# Altium footprint library PcbLib1.PcbLib: 34 footprints (part 2 of 3)
Each footprint in its own frame and in the unit in brackets; x right, y up, seen from the top. Pads: shape width x height; smd on the part's side, far side on the other; paste and mask are expansions set on the pad; w line width, h text height; cw(c..) or ccw(c..) is an arc to the next point about the centre after c.
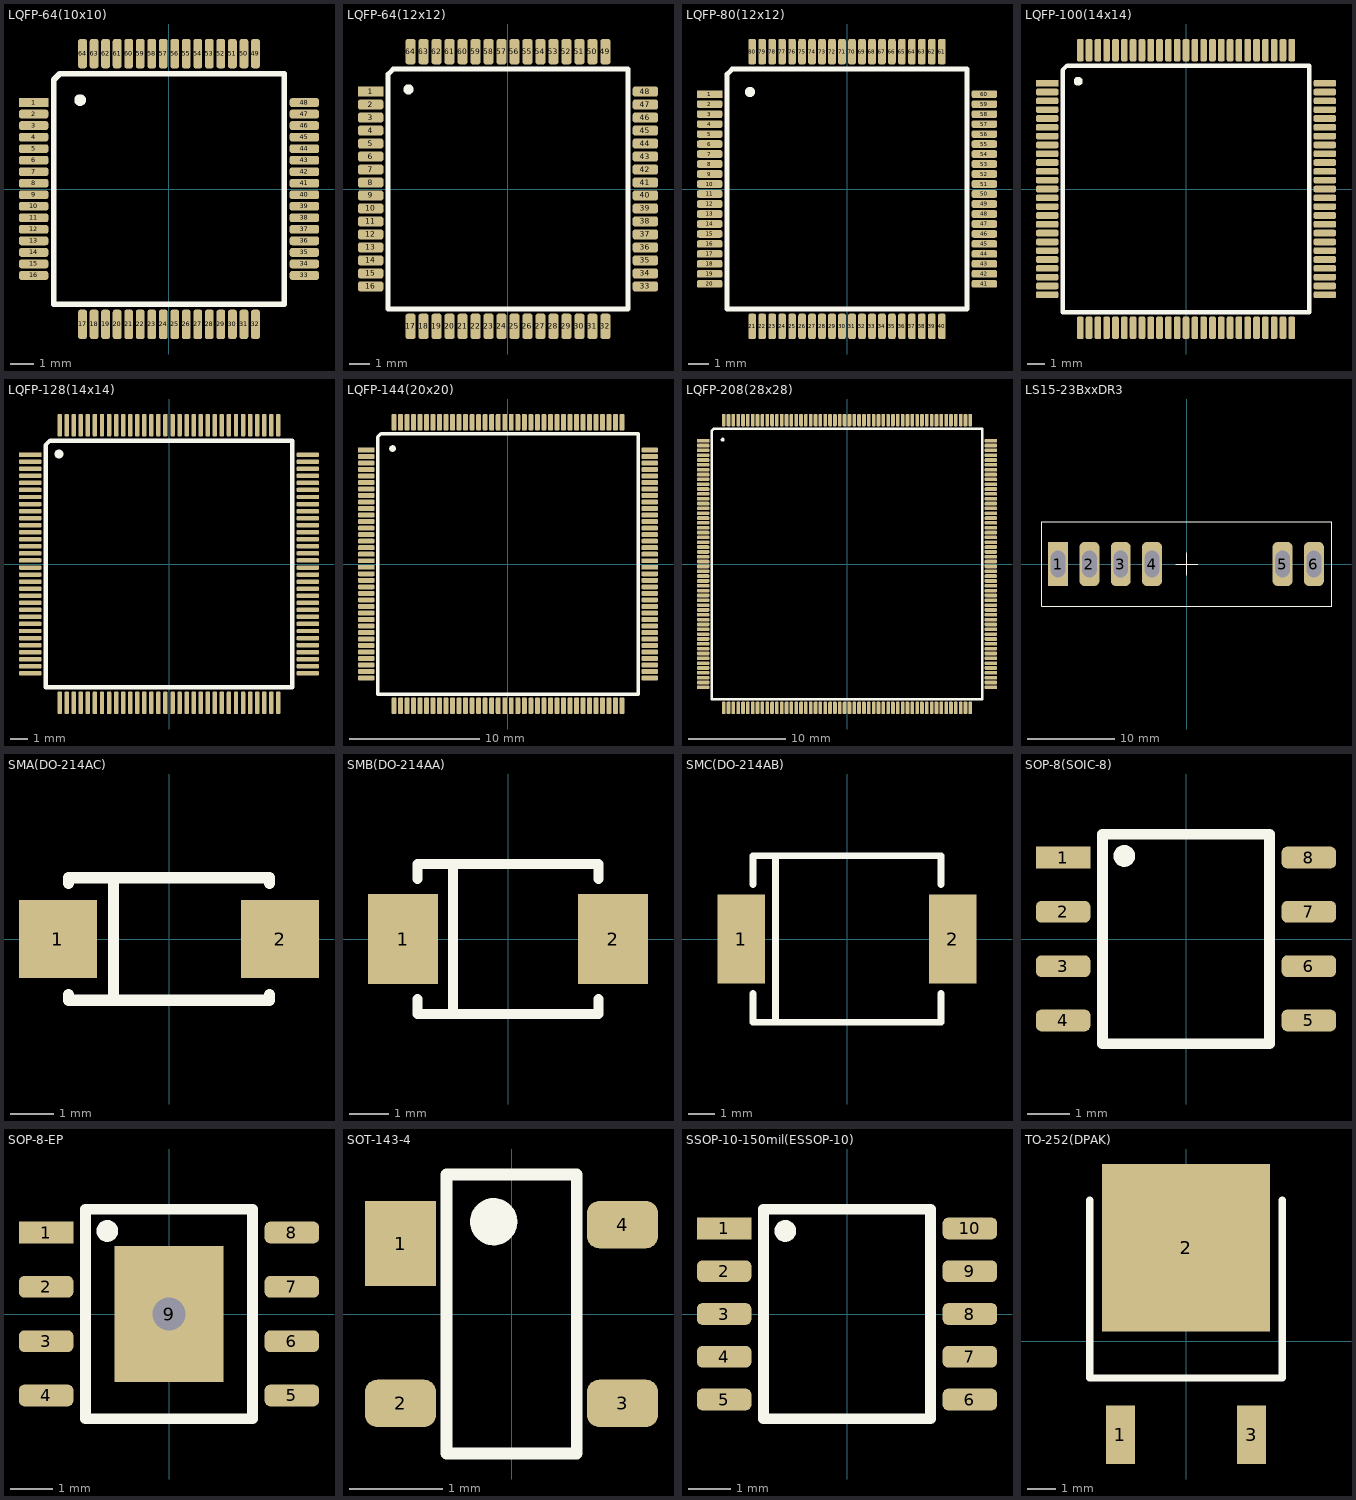
[diagram p1: the footprints below, top view; thin cyan lines are the x and y axes]

## LQFP-64(10x10) [mil]
pads (64):
  rect 50x15 smd: 1(-231.22,147.64)
  rrect50% 50x15 smd: 2(-231.22,127.95) 3(-231.22,108.27) 4(-231.22,88.58) 5(-231.22,68.9) 6(-231.22,49.21) 7(-231.22,29.53) 8(-231.22,9.84) 9(-231.22,-9.84) 10(-231.22,-29.53) 11(-231.22,-49.21) 12(-231.22,-68.9) 13(-231.22,-88.58) 14(-231.22,-108.27) 15(-231.22,-127.95) 16(-231.22,-147.64) 33(231.22,-147.64) 34(231.22,-127.95) 35(231.22,-108.27) 36(231.22,-88.58) 37(231.22,-68.9) 38(231.22,-49.21) 39(231.22,-29.53) 40(231.22,-9.84) 41(231.22,9.84) 42(231.22,29.53) 43(231.22,49.21) 44(231.22,68.9) 45(231.22,88.58) 46(231.22,108.27) 47(231.22,127.95) 48(231.22,147.64)
  rrect50% 15x50 smd: 17(-147.64,-231.22) 18(-127.95,-231.22) 19(-108.27,-231.22) 20(-88.58,-231.22) 21(-68.9,-231.22) 22(-49.21,-231.22) 23(-29.53,-231.22) 24(-9.84,-231.22) 25(9.84,-231.22) 26(29.53,-231.22) 27(49.21,-231.22) 28(68.9,-231.22) 29(88.58,-231.22) 30(108.27,-231.22) 31(127.95,-231.22) 32(147.64,-231.22) 49(147.64,231.22) 50(127.95,231.22) 51(108.27,231.22) 52(88.58,231.22) 53(68.9,231.22) 54(49.21,231.22) 55(29.53,231.22) 56(9.84,231.22) 57(-9.84,231.22) 58(-29.53,231.22) 59(-49.21,231.22) 60(-68.9,231.22) 61(-88.58,231.22) 62(-108.27,231.22) 63(-127.95,231.22) 64(-147.64,231.22)
Top Overlay:
  circle w10: c-151.85,151.85 r5
  lines w10: -196.85,-196.85 -196.85,186.85 -186.85,196.85 196.85,196.85 196.85,-196.85 -196.85,-196.85
3D body "LQFP-64(10x10).step": height 63.11, standoff 0, extent -236.1,-236.1 236.1,236.1

## LQFP-64(12x12) [mil]
pads (64):
  rect 50x20 smd: 1(-270.59,191.93)
  rrect50% 50x20 smd: 2(-270.59,166.34) 3(-270.59,140.75) 4(-270.59,115.16) 5(-270.59,89.57) 6(-270.59,63.98) 7(-270.59,38.39) 8(-270.59,12.79) 9(-270.59,-12.8) 10(-270.59,-38.39) 11(-270.59,-63.98) 12(-270.59,-89.57) 13(-270.59,-115.16) 14(-270.59,-140.75) 15(-270.59,-166.34) 16(-270.59,-191.93) 33(270.59,-191.93) 34(270.59,-166.34) 35(270.59,-140.75) 36(270.59,-115.16) 37(270.59,-89.57) 38(270.59,-63.98) 39(270.59,-38.39) 40(270.59,-12.8) 41(270.59,12.79) 42(270.59,38.39) 43(270.59,63.98) 44(270.59,89.57) 45(270.59,115.16) 46(270.59,140.75) 47(270.59,166.34) 48(270.59,191.93)
  rrect50% 20x50 smd: 17(-191.93,-270.59) 18(-166.34,-270.59) 19(-140.75,-270.59) 20(-115.16,-270.59) 21(-89.57,-270.59) 22(-63.98,-270.59) 23(-38.39,-270.59) 24(-12.8,-270.59) 25(12.79,-270.59) 26(38.39,-270.59) 27(63.98,-270.59) 28(89.57,-270.59) 29(115.16,-270.59) 30(140.75,-270.59) 31(166.34,-270.59) 32(191.93,-270.59) 49(191.93,270.59) 50(166.34,270.59) 51(140.75,270.59) 52(115.16,270.59) 53(89.57,270.59) 54(63.98,270.59) 55(38.39,270.59) 56(12.79,270.59) 57(-12.8,270.59) 58(-38.39,270.59) 59(-63.98,270.59) 60(-89.57,270.59) 61(-115.16,270.59) 62(-140.75,270.59) 63(-166.34,270.59) 64(-191.93,270.59)
Top Overlay:
  circle w10: c-196.22,196.22 r5
  lines w10: -236.22,-236.22 236.22,-236.22 236.22,236.22 -226.22,236.22 -236.22,226.22 -236.22,-236.22
3D body "LQFP-64(12x12).step": height 63.11, standoff 0, extent -279.49,-279.49 279.49,279.49

## LQFP-80(12x12) [mil]
pads (80):
  rect 50x15 smd: 1(-270.59,187.01)
  rrect50% 50x15 smd: 2(-270.59,167.32) 3(-270.59,147.64) 4(-270.59,127.95) 5(-270.59,108.27) 6(-270.59,88.58) 7(-270.59,68.9) 8(-270.59,49.21) 9(-270.59,29.53) 10(-270.59,9.84) 11(-270.59,-9.84) 12(-270.59,-29.53) 13(-270.59,-49.21) 14(-270.59,-68.9) 15(-270.59,-88.58) 16(-270.59,-108.27) 17(-270.59,-127.95) 18(-270.59,-147.64) 19(-270.59,-167.32) 20(-270.59,-187.01) 41(270.59,-187.01) 42(270.59,-167.32) 43(270.59,-147.64) 44(270.59,-127.95) 45(270.59,-108.27) 46(270.59,-88.58) 47(270.59,-68.9) 48(270.59,-49.21) 49(270.59,-29.53) 50(270.59,-9.84) 51(270.59,9.84) 52(270.59,29.53) 53(270.59,49.21) 54(270.59,68.9) 55(270.59,88.58) 56(270.59,108.27) 57(270.59,127.95) 58(270.59,147.64) 59(270.59,167.32) 60(270.59,187.01)
  rrect50% 15x50 smd: 21(-187.01,-270.59) 22(-167.32,-270.59) 23(-147.64,-270.59) 24(-127.95,-270.59) 25(-108.27,-270.59) 26(-88.58,-270.59) 27(-68.9,-270.59) 28(-49.21,-270.59) 29(-29.53,-270.59) 30(-9.84,-270.59) 31(9.84,-270.59) 32(29.53,-270.59) 33(49.21,-270.59) 34(68.9,-270.59) 35(88.58,-270.59) 36(108.27,-270.59) 37(127.95,-270.59) 38(147.64,-270.59) 39(167.32,-270.59) 40(187.01,-270.59) 61(187.01,270.59) 62(167.32,270.59) 63(147.64,270.59) 64(127.95,270.59) 65(108.27,270.59) 66(88.58,270.59) 67(68.9,270.59) 68(49.21,270.59) 69(29.53,270.59) 70(9.84,270.59) 71(-9.84,270.59) 72(-29.53,270.59) 73(-49.21,270.59) 74(-68.9,270.59) 75(-88.58,270.59) 76(-108.27,270.59) 77(-127.95,270.59) 78(-147.64,270.59) 79(-167.32,270.59) 80(-187.01,270.59)
Top Overlay:
  circle w10: c-191.22,191.22 r5
  lines w10: -236.22,-236.22 236.22,-236.22 236.22,236.22 -226.22,236.22 -236.22,226.22 -236.22,-236.22
3D body "LQFP-80(12x12).step": height 63.11, standoff 0, extent -275.51,-275.51 275.51,275.51

## LQFP-100(14x14) [mil]
pads (100):
  rect 50x15 smd: 1(-309.96,236.22)
  rrect50% 50x15 smd: 2(-309.96,216.53) 3(-309.96,196.85) 4(-309.96,177.16) 5(-309.96,157.48) 6(-309.96,137.79) 7(-309.96,118.11) 8(-309.96,98.42) 9(-309.96,78.74) 10(-309.96,59.05) 11(-309.96,39.37) 12(-309.96,19.68) 13(-309.96,0) 14(-309.96,-19.69) 15(-309.96,-39.37) 16(-309.96,-59.06) 17(-309.96,-78.74) 18(-309.96,-98.43) 19(-309.96,-118.11) 20(-309.96,-137.8) 21(-309.96,-157.48) 22(-309.96,-177.17) 23(-309.96,-196.85) 24(-309.96,-216.54) 25(-309.96,-236.22) 51(309.96,-236.22) 52(309.96,-216.54) 53(309.96,-196.85) 54(309.96,-177.17) 55(309.96,-157.48) 56(309.96,-137.8) 57(309.96,-118.11) 58(309.96,-98.43) 59(309.96,-78.74) 60(309.96,-59.06) 61(309.96,-39.37) 62(309.96,-19.69) 63(309.96,0) 64(309.96,19.68) 65(309.96,39.37) 66(309.96,59.05) 67(309.96,78.74) 68(309.96,98.42) 69(309.96,118.11) 70(309.96,137.79) 71(309.96,157.48) 72(309.96,177.16) 73(309.96,196.85) 74(309.96,216.53) 75(309.96,236.22)
  rrect50% 15x50 smd: 26(-236.22,-309.96) 27(-216.54,-309.96) 28(-196.85,-309.96) 29(-177.17,-309.96) 30(-157.48,-309.96) 31(-137.8,-309.96) 32(-118.11,-309.96) 33(-98.43,-309.96) 34(-78.74,-309.96) 35(-59.06,-309.96) 36(-39.37,-309.96) 37(-19.69,-309.96) 38(0,-309.96) 39(19.68,-309.96) 40(39.37,-309.96) 41(59.05,-309.96) 42(78.74,-309.96) 43(98.42,-309.96) 44(118.11,-309.96) 45(137.79,-309.96) 46(157.48,-309.96) 47(177.16,-309.96) 48(196.85,-309.96) 49(216.53,-309.96) 50(236.22,-309.96) 76(236.22,309.96) 77(216.53,309.96) 78(196.85,309.96) 79(177.16,309.96) 80(157.48,309.96) 81(137.79,309.96) 82(118.11,309.96) 83(98.42,309.96) 84(78.74,309.96) 85(59.05,309.96) 86(39.37,309.96) 87(19.68,309.96) 88(0,309.96) 89(-19.69,309.96) 90(-39.37,309.96) 91(-59.06,309.96) 92(-78.74,309.96) 93(-98.43,309.96) 94(-118.11,309.96) 95(-137.8,309.96) 96(-157.48,309.96) 97(-177.17,309.96) 98(-196.85,309.96) 99(-216.54,309.96) 100(-236.22,309.96)
Top Overlay:
  circle w10: c-240.59,240.59 r5
  lines w10: -275.59,-275.59 -275.59,265.59 -265.59,275.59 275.59,275.59 275.59,-275.59 -275.59,-275.59
3D body "LQFP-100(14x14).step": height 63.11, standoff 0, extent -314.84,-314.84 314.84,314.84

## LQFP-128(14x14) [mil]
pads (128):
  rect 50x10 smd: 1(-309.96,244.09)
  rrect50% 50x10 smd: 2(-309.96,228.35) 3(-309.96,212.6) 4(-309.96,196.85) 5(-309.96,181.1) 6(-309.96,165.35) 7(-309.96,149.61) 8(-309.96,133.86) 9(-309.96,118.11) 10(-309.96,102.36) 11(-309.96,86.61) 12(-309.96,70.87) 13(-309.96,55.12) 14(-309.96,39.37) 15(-309.96,23.62) 16(-309.96,7.87) 17(-309.96,-7.87) 18(-309.96,-23.62) 19(-309.96,-39.37) 20(-309.96,-55.12) 21(-309.96,-70.87) 22(-309.96,-86.61) 23(-309.96,-102.36) 24(-309.96,-118.11) 25(-309.96,-133.86) 26(-309.96,-149.61) 27(-309.96,-165.35) 28(-309.96,-181.1) 29(-309.96,-196.85) 30(-309.96,-212.6) 31(-309.96,-228.35) 32(-309.96,-244.09) 65(309.96,-244.09) 66(309.96,-228.35) 67(309.96,-212.6) 68(309.96,-196.85) 69(309.96,-181.1) 70(309.96,-165.35) 71(309.96,-149.61) 72(309.96,-133.86) 73(309.96,-118.11) 74(309.96,-102.36) 75(309.96,-86.61) 76(309.96,-70.87) 77(309.96,-55.12) 78(309.96,-39.37) 79(309.96,-23.62) 80(309.96,-7.87) 81(309.96,7.87) 82(309.96,23.62) 83(309.96,39.37) 84(309.96,55.12) 85(309.96,70.87) 86(309.96,86.61) 87(309.96,102.36) 88(309.96,118.11) 89(309.96,133.86) 90(309.96,149.61) 91(309.96,165.35) 92(309.96,181.1) 93(309.96,196.85) 94(309.96,212.6) 95(309.96,228.35) 96(309.96,244.09)
  rrect50% 10x50 smd: 33(-244.09,-309.96) 34(-228.35,-309.96) 35(-212.6,-309.96) 36(-196.85,-309.96) 37(-181.1,-309.96) 38(-165.35,-309.96) 39(-149.61,-309.96) 40(-133.86,-309.96) 41(-118.11,-309.96) 42(-102.36,-309.96) 43(-86.61,-309.96) 44(-70.87,-309.96) 45(-55.12,-309.96) 46(-39.37,-309.96) 47(-23.62,-309.96) 48(-7.87,-309.96) 49(7.87,-309.96) 50(23.62,-309.96) 51(39.37,-309.96) 52(55.12,-309.96) 53(70.87,-309.96) 54(86.61,-309.96) 55(102.36,-309.96) 56(118.11,-309.96) 57(133.86,-309.96) 58(149.61,-309.96) 59(165.35,-309.96) 60(181.1,-309.96) 61(196.85,-309.96) 62(212.6,-309.96) 63(228.35,-309.96) 64(244.09,-309.96) 97(244.09,309.96) 98(228.35,309.96) 99(212.6,309.96) 100(196.85,309.96) 101(181.1,309.96) 102(165.35,309.96) 103(149.61,309.96) 104(133.86,309.96) 105(118.11,309.96) 106(102.36,309.96) 107(86.61,309.96) 108(70.87,309.96) 109(55.12,309.96) 110(39.37,309.96) 111(23.62,309.96) 112(7.87,309.96) 113(-7.87,309.96) 114(-23.62,309.96) 115(-39.37,309.96) 116(-55.12,309.96) 117(-70.87,309.96) 118(-86.61,309.96) 119(-102.36,309.96) 120(-118.11,309.96) 121(-133.86,309.96) 122(-149.61,309.96) 123(-165.35,309.96) 124(-181.1,309.96) 125(-196.85,309.96) 126(-212.6,309.96) 127(-228.35,309.96) 128(-244.09,309.96)
Top Overlay:
  circle w10: c-245.59,245.59 r5
  lines w10: -275.59,-275.59 275.59,-275.59 275.59,275.59 -265.59,275.59 -275.59,265.59 -275.59,-275.59
3D body "LQFP-128(14x14).step": height 63.11, standoff 0, extent -315,-315 315,315

## LQFP-144(20x20) [mil]
pads (144):
  rect 50x15 smd: 1(-428.07,344.49)
  rrect50% 50x15 smd: 2(-428.07,324.8) 3(-428.07,305.12) 4(-428.07,285.43) 5(-428.07,265.75) 6(-428.07,246.06) 7(-428.07,226.38) 8(-428.07,206.69) 9(-428.07,187.01) 10(-428.07,167.32) 11(-428.07,147.64) 12(-428.07,127.95) 13(-428.07,108.27) 14(-428.07,88.58) 15(-428.07,68.9) 16(-428.07,49.21) 17(-428.07,29.53) 18(-428.07,9.84) 19(-428.07,-9.84) 20(-428.07,-29.53) 21(-428.07,-49.21) 22(-428.07,-68.9) 23(-428.07,-88.58) 24(-428.07,-108.27) 25(-428.07,-127.95) 26(-428.07,-147.64) 27(-428.07,-167.32) 28(-428.07,-187.01) 29(-428.07,-206.69) 30(-428.07,-226.38) 31(-428.07,-246.06) 32(-428.07,-265.75) 33(-428.07,-285.43) 34(-428.07,-305.12) 35(-428.07,-324.8) 36(-428.07,-344.49) 73(428.07,-344.49) 74(428.07,-324.8) 75(428.07,-305.12) 76(428.07,-285.43) 77(428.07,-265.75) 78(428.07,-246.06) 79(428.07,-226.38) 80(428.07,-206.69) 81(428.07,-187.01) 82(428.07,-167.32) 83(428.07,-147.64) 84(428.07,-127.95) 85(428.07,-108.27) 86(428.07,-88.58) 87(428.07,-68.9) 88(428.07,-49.21) 89(428.07,-29.53) 90(428.07,-9.84) 91(428.07,9.84) 92(428.07,29.53) 93(428.07,49.21) 94(428.07,68.9) 95(428.07,88.58) 96(428.07,108.27) 97(428.07,127.95) 98(428.07,147.64) 99(428.07,167.32) 100(428.07,187.01) 101(428.07,206.69) 102(428.07,226.38) 103(428.07,246.06) 104(428.07,265.75) 105(428.07,285.43) 106(428.07,305.12) 107(428.07,324.8) 108(428.07,344.49)
  rrect50% 15x50 smd: 37(-344.49,-428.07) 38(-324.8,-428.07) 39(-305.12,-428.07) 40(-285.43,-428.07) 41(-265.75,-428.07) 42(-246.06,-428.07) 43(-226.38,-428.07) 44(-206.69,-428.07) 45(-187.01,-428.07) 46(-167.32,-428.07) 47(-147.64,-428.07) 48(-127.95,-428.07) 49(-108.27,-428.07) 50(-88.58,-428.07) 51(-68.9,-428.07) 52(-49.21,-428.07) 53(-29.53,-428.07) 54(-9.84,-428.07) 55(9.84,-428.07) 56(29.53,-428.07) 57(49.21,-428.07) 58(68.9,-428.07) 59(88.58,-428.07) 60(108.27,-428.07) 61(127.95,-428.07) 62(147.64,-428.07) 63(167.32,-428.07) 64(187.01,-428.07) 65(206.69,-428.07) 66(226.38,-428.07) 67(246.06,-428.07) 68(265.75,-428.07) 69(285.43,-428.07) 70(305.12,-428.07) 71(324.8,-428.07) 72(344.49,-428.07) 109(344.49,428.07) 110(324.8,428.07) 111(305.12,428.07) 112(285.43,428.07) 113(265.75,428.07) 114(246.06,428.07) 115(226.38,428.07) 116(206.69,428.07) 117(187.01,428.07) 118(167.32,428.07) 119(147.64,428.07) 120(127.95,428.07) 121(108.27,428.07) 122(88.58,428.07) 123(68.9,428.07) 124(49.21,428.07) 125(29.53,428.07) 126(9.84,428.07) 127(-9.84,428.07) 128(-29.53,428.07) 129(-49.21,428.07) 130(-68.9,428.07) 131(-88.58,428.07) 132(-108.27,428.07) 133(-127.95,428.07) 134(-147.64,428.07) 135(-167.32,428.07) 136(-187.01,428.07) 137(-206.69,428.07) 138(-226.38,428.07) 139(-246.06,428.07) 140(-265.75,428.07) 141(-285.43,428.07) 142(-305.12,428.07) 143(-324.8,428.07) 144(-344.49,428.07)
Top Overlay:
  circle w10: c-348.7,348.7 r5
  lines w10: -393.7,-393.7 -393.7,383.7 -383.7,393.7 393.7,393.7 393.7,-393.7 -393.7,-393.7
3D body "LQFP-144(20x20).step": height 63.11, standoff 0, extent -431.02,-431.02 431.02,431.02

## LQFP-208(28x28) [mil]
pads (208):
  rect 50x15 smd: 1(-585.55,501.97)
  rrect50% 50x15 smd: 2(-585.55,482.28) 3(-585.55,462.6) 4(-585.55,442.91) 5(-585.55,423.23) 6(-585.55,403.54) 7(-585.55,383.86) 8(-585.55,364.17) 9(-585.55,344.49) 10(-585.55,324.8) 11(-585.55,305.12) 12(-585.55,285.43) 13(-585.55,265.75) 14(-585.55,246.06) 15(-585.55,226.38) 16(-585.55,206.69) 17(-585.55,187.01) 18(-585.55,167.32) 19(-585.55,147.64) 20(-585.55,127.95) 21(-585.55,108.27) 22(-585.55,88.58) 23(-585.55,68.9) 24(-585.55,49.21) 25(-585.55,29.53) 26(-585.55,9.84) 27(-585.55,-9.84) 28(-585.55,-29.53) 29(-585.55,-49.21) 30(-585.55,-68.9) 31(-585.55,-88.58) 32(-585.55,-108.27) 33(-585.55,-127.95) 34(-585.55,-147.64) 35(-585.55,-167.32) 36(-585.55,-187.01) 37(-585.55,-206.69) 38(-585.55,-226.38) 39(-585.55,-246.06) 40(-585.55,-265.75) 41(-585.55,-285.43) 42(-585.55,-305.12) 43(-585.55,-324.8) 44(-585.55,-344.49) 45(-585.55,-364.17) 46(-585.55,-383.86) 47(-585.55,-403.54) 48(-585.55,-423.23) 49(-585.55,-442.91) 50(-585.55,-462.6) 51(-585.55,-482.28) 52(-585.55,-501.97) 105(585.55,-501.97) 106(585.55,-482.28) 107(585.55,-462.6) 108(585.55,-442.91) 109(585.55,-423.23) 110(585.55,-403.54) 111(585.55,-383.86) 112(585.55,-364.17) 113(585.55,-344.49) 114(585.55,-324.8) 115(585.55,-305.12) 116(585.55,-285.43) 117(585.55,-265.75) 118(585.55,-246.06) 119(585.55,-226.38) 120(585.55,-206.69) 121(585.55,-187.01) 122(585.55,-167.32) 123(585.55,-147.64) 124(585.55,-127.95) 125(585.55,-108.27) 126(585.55,-88.58) 127(585.55,-68.9) 128(585.55,-49.21) 129(585.55,-29.53) 130(585.55,-9.84) 131(585.55,9.84) 132(585.55,29.53) 133(585.55,49.21) 134(585.55,68.9) 135(585.55,88.58) 136(585.55,108.27) 137(585.55,127.95) 138(585.55,147.64) 139(585.55,167.32) 140(585.55,187.01) 141(585.55,206.69) 142(585.55,226.38) 143(585.55,246.06) 144(585.55,265.75) 145(585.55,285.43) 146(585.55,305.12) 147(585.55,324.8) 148(585.55,344.49) 149(585.55,364.17) 150(585.55,383.86) 151(585.55,403.54) 152(585.55,423.23) 153(585.55,442.91) 154(585.55,462.6) 155(585.55,482.28) 156(585.55,501.97)
  rrect50% 15x50 smd: 53(-501.97,-585.55) 54(-482.28,-585.55) 55(-462.6,-585.55) 56(-442.91,-585.55) 57(-423.23,-585.55) 58(-403.54,-585.55) 59(-383.86,-585.55) 60(-364.17,-585.55) 61(-344.49,-585.55) 62(-324.8,-585.55) 63(-305.12,-585.55) 64(-285.43,-585.55) 65(-265.75,-585.55) 66(-246.06,-585.55) 67(-226.38,-585.55) 68(-206.69,-585.55) 69(-187.01,-585.55) 70(-167.32,-585.55) 71(-147.64,-585.55) 72(-127.95,-585.55) 73(-108.27,-585.55) 74(-88.58,-585.55) 75(-68.9,-585.55) 76(-49.21,-585.55) 77(-29.53,-585.55) 78(-9.84,-585.55) 79(9.84,-585.55) 80(29.53,-585.55) 81(49.21,-585.55) 82(68.9,-585.55) 83(88.58,-585.55) 84(108.27,-585.55) 85(127.95,-585.55) 86(147.64,-585.55) 87(167.32,-585.55) 88(187.01,-585.55) 89(206.69,-585.55) 90(226.38,-585.55) 91(246.06,-585.55) 92(265.75,-585.55) 93(285.43,-585.55) 94(305.12,-585.55) 95(324.8,-585.55) 96(344.49,-585.55) 97(364.17,-585.55) 98(383.86,-585.55) 99(403.54,-585.55) 100(423.23,-585.55) 101(442.91,-585.55) 102(462.6,-585.55) 103(482.28,-585.55) 104(501.97,-585.55) 157(501.97,585.55) 158(482.28,585.55) 159(462.6,585.55) 160(442.91,585.55) 161(423.23,585.55) 162(403.54,585.55) 163(383.86,585.55) 164(364.17,585.55) 165(344.49,585.55) 166(324.8,585.55) 167(305.12,585.55) 168(285.43,585.55) 169(265.75,585.55) 170(246.06,585.55) 171(226.38,585.55) 172(206.69,585.55) 173(187.01,585.55) 174(167.32,585.55) 175(147.64,585.55) 176(127.95,585.55) 177(108.27,585.55) 178(88.58,585.55) 179(68.9,585.55) 180(49.21,585.55) 181(29.53,585.55) 182(9.84,585.55) 183(-9.84,585.55) 184(-29.53,585.55) 185(-49.21,585.55) 186(-68.9,585.55) 187(-88.58,585.55) 188(-108.27,585.55) 189(-127.95,585.55) 190(-147.64,585.55) 191(-167.32,585.55) 192(-187.01,585.55) 193(-206.69,585.55) 194(-226.38,585.55) 195(-246.06,585.55) 196(-265.75,585.55) 197(-285.43,585.55) 198(-305.12,585.55) 199(-324.8,585.55) 200(-344.49,585.55) 201(-364.17,585.55) 202(-383.86,585.55) 203(-403.54,585.55) 204(-423.23,585.55) 205(-442.91,585.55) 206(-462.6,585.55) 207(-482.28,585.55) 208(-501.97,585.55)
Top Overlay:
  circle w10: c-506.18,506.18 r2.72
  lines w10: -551.18,-551.18 -551.18,541.18 -541.18,551.18 551.18,551.18 551.18,-551.18 -551.18,-551.18
3D body "LQFP-208(28x28).step": height 63.11, standoff 0, extent -594.49,-594.49 594.49,594.49

## LS15-23BxxDR3 [mil]
pads (6):
  rect 90x200 hole 65 slot 120 at 90 deg: 1(-582.68,0)
  rrect50% 90x200 hole 65 slot 120 at 90 deg: 2(-440.94,0) 3(-299.21,0) 4(-157.48,0) 5(433.86,0) 6(575.59,0)
Top Overlay:
  lines w5: -50,0 50,0 ; 0,-50 0,50 ; -656.3,-191.34 656.3,-191.34 656.3,191.34 -656.3,191.34 -656.3,-191.34
3D body "LS15-23BxxDR3.stp": height 847.34, standoff -130.26, extent -656.35,-191.34 656.25,191.34

## SMA(DO-214AC) [mil]
pads (2):
  rect 70x70 smd: 1(-100,0) 2(100,0)
Top Overlay:
  lines w10: -90.55,-50 -90.55,-55.12 90.55,-55.12 90.55,-50 ; -90.55,50 -90.55,55.12 90.55,55.12 90.55,50 ; -50,-55.12 -50,55.12
3D body "SMA(DO-214AC).step": height 104.09, standoff 0.07, extent -105.51,-57.01 105.51,57.01

## SMB(DO-214AA) [mil]
pads (2):
  rect 70x90 smd: 1(-105,0) 2(105,0)
Top Overlay:
  lines w10: -90.55,-60 -90.55,-74.8 90.55,-74.8 90.55,-60 ; -90.55,60 -90.55,74.8 90.55,74.8 90.55,60 ; -55,-74.8 -55,74.8
3D body "SMB(DO-214AA).step": height 104.09, standoff 0.07, extent -110,-77.99 110,77.99

## SMC(DO-214AB) [mil]
pads (2):
  rect 70x130 smd: 1(-155,0) 2(155,0)
Top Overlay:
  lines w10: -137.8,-80 -137.8,-122.05 137.8,-122.05 137.8,-80 ; -137.8,80 -137.8,122.05 137.8,122.05 137.8,80 ; -105,-122.05 -105,122.05
3D body "SMC(DO-214AB).step": height 104.09, standoff 0.03, extent -160.51,-122.99 160.51,122.99

## SOP-8(SOIC-8) [mil]
pads (8):
  rect 50x20 smd: 1(-113.11,75)
  rrect50% 50x20 smd: 2(-113.11,25) 3(-113.11,-25) 4(-113.11,-75) 5(113.11,-75) 6(113.11,-25) 7(113.11,25) 8(113.11,75)
Top Overlay:
  circle w10: c-56.77,76.46 r5
  lines w10: -76.77,-96.46 -76.77,96.46 76.77,96.46 76.77,-96.46 -76.77,-96.46
3D body "SOP-8(SOIC-8).step": height 66.93, standoff 0, extent -118.11,-96.46 118.11,96.46

## SOP-8-EP [mil]
pads (9):
  rect 50x20 smd: 1(-113.11,75)
  rrect50% 50x20 smd: 2(-113.11,25) 3(-113.11,-25) 4(-113.11,-75) 5(113.11,-75) 6(113.11,-25) 7(113.11,25) 8(113.11,75)
  rect 100x125 smd: 9(0,0)
via 0,0 diameter 40 hole 30
Top Overlay:
  circle w10: c-56.77,76.46 r5
  lines w10: -76.77,-96.46 -76.77,96.46 76.77,96.46 76.77,-96.46 -76.77,-96.46
3D body "SOP-8-EP.step": height 66.93, standoff 0, extent -118.11,-96.46 118.11,96.46

## SOT-143-4 [mil]
pads (4):
  rect 30x36 smd: 1(-46.97,29.8)
  rrect50% 30x20 smd: 2(-46.97,-37.8) 3(46.97,-37.8) 4(46.97,37.8)
Top Overlay:
  circle w10: c-7.56,39.06 r5
  lines w5: -27.56,-59.06 27.56,-59.06 27.56,59.06 -27.56,59.06 -27.56,-59.06
3D body "SOT-143-4.step": height 43.96, standoff -0.13, extent -46.65,-57.48 46.65,57.48

## SSOP-10-150mil(ESSOP-10) [mil]
pads (10):
  rect 50x20 smd: 1(-113.11,78.74)
  rrect50% 50x20 smd: 2(-113.11,39.37) 3(-113.11,0) 4(-113.11,-39.37) 5(-113.11,-78.74) 6(113.11,-78.74) 7(113.11,-39.37) 8(113.11,0) 9(113.11,39.37) 10(113.11,78.74)
Top Overlay:
  circle w10: c-56.77,76.46 r5
  lines w10: -76.77,-96.46 -76.77,96.46 76.77,96.46 76.77,-96.46 -76.77,-96.46
3D body "SSOP-10-150mil(ESSOP-10).step": height 68.9, standoff 0, extent -118.11,-96.46 118.11,96.46

## TO-252(DPAK) [mil]
pads (3):
  rect 40x80 smd: 1(-90,-128.25) 3(90,-128.25)
  rect 230x230 smd: 2(0,128.25)
Top Overlay:
  lines w10: -131.89,193.8 -131.89,-50.3 131.89,-50.3 131.89,193.8
3D body "TO-252(DPAK).step": height 90.16, standoff -0.39, extent -130,-150.62 127.48,230.03